# Altium footprint library con-molex.PCBLIB: 369 footprints (part 20 of 26)
Each footprint in its own frame and in the unit in brackets; x right, y up, seen from the top. Pads: shape width x height; smd on the part's side, far side on the other; paste and mask are expansions set on the pad; w line width, h text height; cw(c..) or ccw(c..) is an arc to the next point about the centre after c.
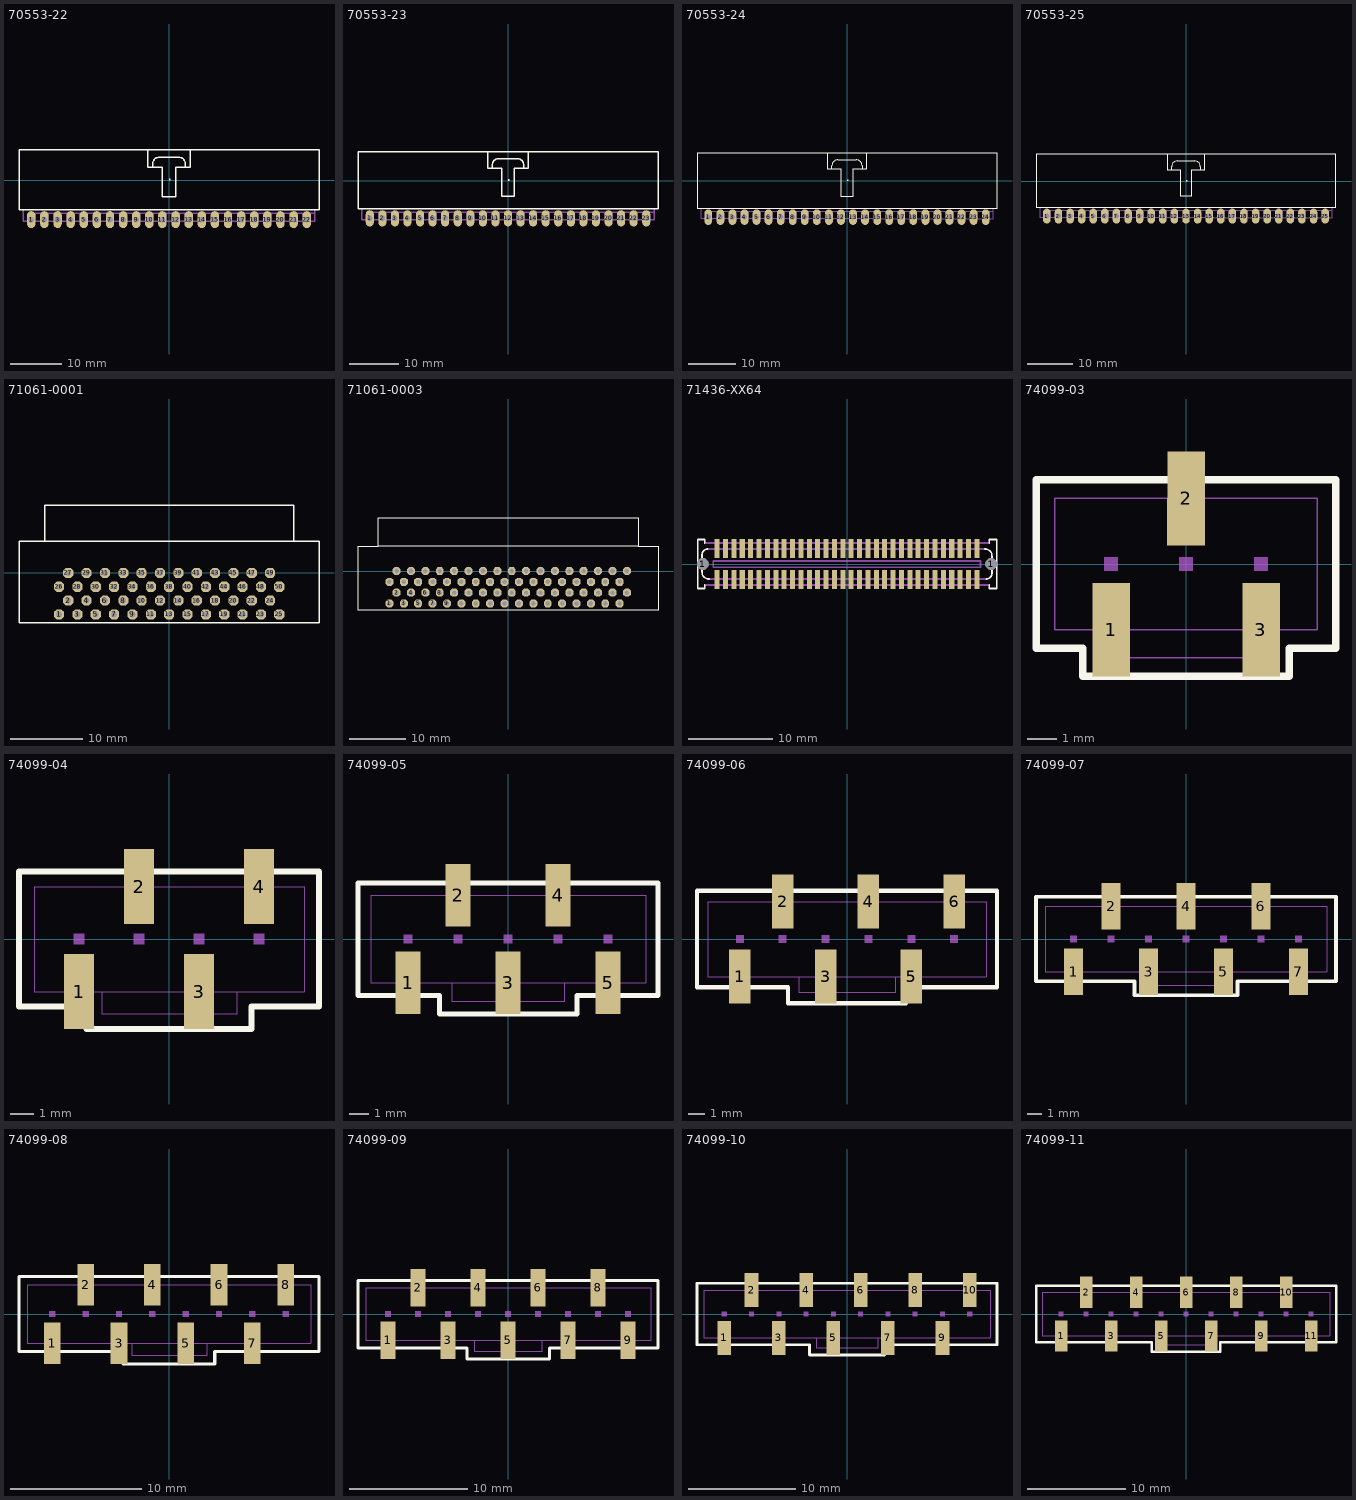
[diagram p19: the footprints below, top view; thin cyan lines are the x and y axes]

## 70553-22 [mil]
pads (22):
  oval 64.5x129 hole 43: 1(-1050,-300) 2(-950,-300) 3(-850,-300) 4(-750,-300) 5(-650,-300) 6(-550,-300) 7(-450,-300) 8(-350,-300) 9(-250,-300) 10(-150,-300) 11(-50,-300) 12(50,-300) 13(150,-300) 14(250,-300) 15(350,-300) 16(450,-300) 17(550,-300) 18(650,-300) 19(750,-300) 20(850,-300) 21(950,-300) 22(1050,-300)
Top Overlay:
  region: 0,0 10,0 10,10 0,10
  lines w10: -162.5,231.25 -162.5,100 -125,100 ; -125,100 -50,100 -50,-125 50,-125 50,100 125,100 ; -125,100 -125,125 cw(c-75,125) -75,175 75,175 cw(c75,125) 125,125 125,100 ; 125,100 162.5,100 162.5,231.25 ; 162.5,231.25 1143.75,231.25 1143.75,-225 -1143.75,-225 -1143.75,231.25 162.5,231.25
Mechanical 16:
  drawing of 178 lines, arcs and shapes, not listed

## 70553-23 [mil]
pads (23):
  oval 64.5x129 hole 43: 1(-1100,-300) 2(-1000,-300) 3(-900,-300) 4(-800,-300) 5(-700,-300) 6(-600,-300) 7(-500,-300) 8(-400,-300) 9(-300,-300) 10(-200,-300) 11(-100,-300) 12(0,-300) 13(100,-300) 14(200,-300) 15(300,-300) 16(400,-300) 17(500,-300) 18(600,-300) 19(700,-300) 20(800,-300) 21(900,-300) 22(1000,-300) 23(1100,-300)
Top Overlay:
  region: 0,0 10,0 10,10 0,10
  lines w10: -162.5,231.25 -162.5,100 -125,100 ; -125,100 -50,100 -50,-125 50,-125 50,100 125,100 ; -125,100 -125,125 cw(c-75,125) -75,175 75,175 cw(c75,125) 125,125 125,100 ; 125,100 162.5,100 162.5,231.25 ; 162.5,231.25 1193.75,231.25 1193.75,-225 -1193.75,-225 -1193.75,231.25 162.5,231.25
Mechanical 16:
  drawing of 186 lines, arcs and shapes, not listed

## 70553-24 [mil]
pads (24):
  oval 64.5x129 hole 43: 1(-1150,-300) 2(-1050,-300) 3(-950,-300) 4(-850,-300) 5(-750,-300) 6(-650,-300) 7(-550,-300) 8(-450,-300) 9(-350,-300) 10(-250,-300) 11(-150,-300) 12(-50,-300) 13(50,-300) 14(150,-300) 15(250,-300) 16(350,-300) 17(450,-300) 18(550,-300) 19(650,-300) 20(750,-300) 21(850,-300) 22(950,-300) 23(1050,-300) 24(1150,-300)
Top Overlay:
  region: 0,0 10,0 10,10 0,10
  lines w10: -162.5,231.25 -162.5,100 -125,100 ; -125,100 -50,100 -50,-125 50,-125 50,100 125,100 ; -125,100 -125,125 cw(c-75,125) -75,175 75,175 cw(c75,125) 125,125 125,100 ; 125,100 162.5,100 162.5,231.25 ; 162.5,231.25 1243.75,231.25 1243.75,-225 -1243.75,-225 -1243.75,231.25 162.5,231.25
Mechanical 16:
  drawing of 194 lines, arcs and shapes, not listed

## 70553-25 [mil]
pads (25):
  oval 64.5x129 hole 43: 1(-1200,-300) 2(-1100,-300) 3(-1000,-300) 4(-900,-300) 5(-800,-300) 6(-700,-300) 7(-600,-300) 8(-500,-300) 9(-400,-300) 10(-300,-300) 11(-200,-300) 12(-100,-300) 13(0,-300) 14(100,-300) 15(200,-300) 16(300,-300) 17(400,-300) 18(500,-300) 19(600,-300) 20(700,-300) 21(800,-300) 22(900,-300) 23(1000,-300) 24(1100,-300) 25(1200,-300)
Top Overlay:
  region: 0,0 10,0 10,10 0,10
  lines w10: -162.5,231.25 -162.5,100 -125,100 ; -125,100 -50,100 -50,-125 50,-125 50,100 125,100 ; -125,100 -125,125 cw(c-75,125) -75,175 75,175 cw(c75,125) 125,125 125,100 ; 125,100 162.5,100 162.5,231.25 ; 162.5,231.25 1293.75,231.25 1293.75,-225 -1293.75,-225 -1293.75,231.25 162.5,231.25
Mechanical 16:
  drawing of 202 lines, arcs and shapes, not listed

## 71061-0001 [mil]
pads (50):
  oct 55x55 hole 32: 1(-600,-225.59) 2(-550,-150.39) 3(-500,-225.59) 4(-450,-150.39) 5(-400,-225.59) 6(-350,-150.39) 7(-300,-225.59) 8(-250,-150.39) 9(-200,-225.59) 10(-150,-150.39) 11(-100,-225.59) 12(-50,-150.39) 13(0,-225.59) 14(50,-150.39) 15(100,-225.59) 16(150,-150.39) 17(200,-225.59) 18(250,-150.39) 19(300,-225.59) 20(350,-150.39) 21(400,-225.59) 22(450,-150.39) 23(500,-225.59) 24(550,-150.39) 25(600,-225.59) 26(-600,-75.2) 27(-550,0) 28(-500,-75.2) 29(-450,0) 30(-400,-75.2) 31(-350,0) 32(-300,-75.2) 33(-250,0) 34(-200,-75.2) 35(-150,0) 36(-100,-75.2) 37(-50,0) 38(0,-75.2) 39(50,0) 40(100,-75.2) 41(150,0) 42(200,-75.2) 43(250,0) 44(300,-75.2) 45(350,0) 46(400,-75.2) 47(450,0) 48(500,-75.2) 49(550,0) 50(600,-75.2)
Top Overlay:
  lines w8: -678.54,171.85 -818.31,171.85 -818.31,-271.06 816.34,-271.06 816.34,171.85 678.54,171.85 ; -678.54,171.85 -678.54,368.7 678.54,368.7 678.54,171.85 ; -678.54,171.85 678.54,171.85

## 71061-0003 [mil]
pads (68):
  oct 55x55 hole 32: 1(-825,-225.59) 2(-775,-150.39) 3(-725,-225.59) 4(-675,-150.39) 5(-625,-225.59) 6(-575,-150.39) 7(-525,-225.59) 8(-475,-150.39) 9(-425,-225.59) 10(-375,-150.39) 11(-325,-225.59) 12(-275,-150.39) 13(-225,-225.59) 14(-175,-150.39) 15(-125,-225.59) 16(-75,-150.39) 17(-25,-225.59) 18(25,-150.39) 19(75,-225.59) 20(125,-150.39) 21(175,-225.59) 22(225,-150.39) 23(275,-225.59) 24(325,-150.39) 25(375,-225.59) 26(425,-150.39) 27(475,-225.59) 28(525,-150.39) 29(575,-225.59) 30(625,-150.39) 31(675,-225.59) 32(725,-150.39) 33(775,-225.59) 34(825,-150.39) 35(-825,-75.2) 36(-775,0) 37(-725,-75.2) 38(-675,0) 39(-625,-75.2) 40(-575,0) 41(-525,-75.2) 42(-475,0) 43(-425,-75.2) 44(-375,0) 45(-325,-75.2) 46(-275,0) 47(-225,-75.2) 48(-175,0) 49(-125,-75.2) 50(-75,0) 51(-25,-75.2) 52(25,0) 53(75,-75.2) 54(125,0) 55(175,-75.2) 56(225,0) 57(275,-75.2) 58(325,0) 59(375,-75.2) 60(425,0) 61(475,-75.2) 62(525,0) 63(575,-75.2) 64(625,0) 65(675,-75.2) 66(725,0) 67(775,-75.2) 68(825,0)
Top Overlay:
  lines w8: -903.54,171.85 -1043.31,171.85 -1043.31,-271.06 1041.34,-271.06 1041.34,171.85 903.54,171.85 ; -903.54,171.85 -903.54,368.7 903.54,368.7 903.54,171.85 ; -903.54,171.85 903.54,171.85

## 71436-XX64 [mil]
pads (66):
  round 55.12 hole 55.12: 1(-677.17,0) 1(677.17,0)
  rect 23.62x90.55 smd: 1(-610.24,-72.83) 2(-570.87,-72.83) 3(-531.5,-72.83) 4(-492.13,-72.83) 5(-452.76,-72.83) 6(-413.39,-72.83) 7(-374.02,-72.83) 8(-334.65,-72.83) 9(-295.28,-72.83) 10(-255.91,-72.83) 11(-216.54,-72.83) 12(-177.17,-72.83) 13(-137.8,-72.83) 14(-98.43,-72.83) 15(-59.06,-72.83) 16(-19.69,-72.83) 17(19.69,-72.83) 18(59.06,-72.83) 19(98.43,-72.83) 20(137.8,-72.83) 21(177.17,-72.83) 22(216.54,-72.83) 23(255.91,-72.83) 24(295.28,-72.83) 25(334.65,-72.83) 26(374.02,-72.83) 27(413.39,-72.83) 28(452.76,-72.83) 29(492.13,-72.83) 30(531.5,-72.83) 31(570.87,-72.83) 32(610.24,-72.83) 33(-610.24,72.83) 34(-570.87,72.83) 35(-531.5,72.83) 36(-492.13,72.83) 37(-452.76,72.83) 38(-413.39,72.83) 39(-374.02,72.83) 40(-334.65,72.83) 41(-295.28,72.83) 42(-255.91,72.83) 43(-216.54,72.83) 44(-177.17,72.83) 45(-137.8,72.83) 46(-98.43,72.83) 47(-59.06,72.83) 48(-19.69,72.83) 49(19.69,72.83) 50(59.06,72.83) 51(98.43,72.83) 52(137.8,72.83) 53(177.17,72.83) 54(216.54,72.83) 55(255.91,72.83) 56(295.28,72.83) 57(334.65,72.83) 58(374.02,72.83) 59(413.39,72.83) 60(452.76,72.83) 61(492.13,72.83) 62(531.5,72.83) 63(570.87,72.83) 64(610.24,72.83)
Top Overlay:
  lines w8: -681.1,-39.37 ccw(c-649.21,-38.98) -648.82,-70.87 ; -681.1,-38.58 -681.1,40.16 cw(c-652.36,42.13) -654.33,70.87 ; -668.5,98.43 -668.5,114.96 -701.57,114.96 -701.57,-114.96 -667.72,-114.96 -667.72,-98.43 ; 648.82,70.87 cw(c649.21,38.98) 681.1,39.37 ; 654.33,-70.87 ccw(c652.36,-42.13) 681.1,-40.16 681.1,38.58 ; 667.72,98.43 667.72,114.96 703.15,114.96 703.15,-114.96 668.5,-114.96 668.5,-98.43
Mechanical 16:
  lines w8: -668.5,98.43 667.72,98.43 ; -667.72,-98.43 668.5,-98.43 ; -654.33,70.87 648.82,70.87 ; -648.82,-70.87 653.54,-70.87 654.33,-70.87 ; -628.35,-15.75 627.56,-15.75 627.56,14.17 -628.35,14.17 -628.35,-15.75

## 74099-03 [mil]
pads (3):
  rect 50x125 smd: 1(-100,-87.5) 2(0,87.5) 3(100,-87.5)
Top Overlay:
  lines w10: -200,-112.5 -200,112.5 200,112.5 200,-112.5 137.5,-112.5 137.5,-150 -137.5,-150 -137.5,-112.5 -200,-112.5
Mechanical 16:
  rectangle: -109.37,-9.37 -90.63,9.37
  rectangle: 90.63,-9.37 109.37,9.37
  rectangle: -9.37,-9.37 9.37,9.37
  lines w2: -112.5,-87.5 -175,-87.5 -175,87.5 175,87.5 175,-87.5 112.5,-87.5 ; -112.5,-87.5 112.5,-87.5 ; -112.5,-87.5 -112.5,-125 112.5,-125 112.5,-87.5
  text "1" at -162.5,-75 h62

## 74099-04 [mil]
pads (4):
  rect 50x125 smd: 1(-150,-87.5) 2(-50,87.5) 3(50,-87.5) 4(150,87.5)
Top Overlay:
  lines w10: -250,-112.5 -250,112.5 250,112.5 250,-112.5 137.5,-112.5 137.5,-150 -137.5,-150 -137.5,-112.5 -250,-112.5
Mechanical 16:
  rectangle: -59.37,-9.37 -40.63,9.37
  rectangle: -159.37,-9.37 -140.63,9.37
  rectangle: 140.63,-9.37 159.37,9.37
  rectangle: 40.63,-9.37 59.37,9.37
  lines w2: -112.5,-87.5 -225,-87.5 -225,87.5 225,87.5 225,-87.5 112.5,-87.5 ; -112.5,-87.5 112.5,-87.5 ; -112.5,-87.5 -112.5,-125 112.5,-125 112.5,-87.5
  text "1" at -212.5,-75 h62

## 74099-05 [mil]
pads (5):
  rect 50x125 smd: 1(-200,-87.5) 2(-100,87.5) 3(0,-87.5) 4(100,87.5) 5(200,-87.5)
Top Overlay:
  lines w10: -300,-112.5 -300,112.5 300,112.5 300,-112.5 137.5,-112.5 137.5,-150 -137.5,-150 -137.5,-112.5 -300,-112.5
Mechanical 16:
  rectangle: -9.37,-9.37 9.37,9.37
  rectangle: -109.37,-9.37 -90.63,9.37
  rectangle: 190.63,-9.37 209.37,9.37
  rectangle: 90.63,-9.37 109.37,9.37
  rectangle: -209.37,-9.37 -190.63,9.37
  lines w2: -112.5,-87.5 -275,-87.5 -275,87.5 275,87.5 275,-87.5 112.5,-87.5 ; -112.5,-87.5 112.5,-87.5 ; -112.5,-87.5 -112.5,-125 112.5,-125 112.5,-87.5
  text "1" at -262.5,-75 h62

## 74099-06 [mil]
pads (6):
  rect 50x125 smd: 1(-250,-87.5) 2(-150,87.5) 3(-50,-87.5) 4(50,87.5) 5(150,-87.5) 6(250,87.5)
Top Overlay:
  lines w10: -350,-112.5 -350,112.5 350,112.5 350,-112.5 137.5,-112.5 137.5,-150 -137.5,-150 -137.5,-112.5 -350,-112.5
Mechanical 16:
  rectangle: -59.37,-9.37 -40.63,9.37
  rectangle: -159.37,-9.37 -140.63,9.37
  rectangle: 140.63,-9.37 159.37,9.37
  rectangle: 40.63,-9.37 59.37,9.37
  rectangle: -259.37,-9.37 -240.63,9.37
  rectangle: 240.63,-9.37 259.37,9.37
  lines w2: -112.5,-87.5 -325,-87.5 -325,87.5 325,87.5 325,-87.5 112.5,-87.5 ; -112.5,-87.5 112.5,-87.5 ; -112.5,-87.5 -112.5,-125 112.5,-125 112.5,-87.5
  text "1" at -312.5,-75 h62

## 74099-07 [mil]
pads (7):
  rect 50x125 smd: 1(-300,-87.5) 2(-200,87.5) 3(-100,-87.5) 4(0,87.5) 5(100,-87.5) 6(200,87.5) 7(300,-87.5)
Top Overlay:
  lines w10: -400,-112.5 -400,112.5 400,112.5 400,-112.5 137.5,-112.5 137.5,-150 -137.5,-150 -137.5,-112.5 -400,-112.5
Mechanical 16:
  rectangle: -109.37,-9.37 -90.63,9.37
  rectangle: -209.37,-9.37 -190.63,9.37
  rectangle: 90.63,-9.37 109.37,9.37
  rectangle: -9.37,-9.37 9.37,9.37
  rectangle: -309.37,-9.37 -290.63,9.37
  rectangle: 190.63,-9.37 209.37,9.37
  rectangle: 290.63,-9.37 309.37,9.37
  lines w2: -112.5,-87.5 -375,-87.5 -375,87.5 375,87.5 375,-87.5 112.5,-87.5 ; -112.5,-87.5 112.5,-87.5 ; -112.5,-87.5 -112.5,-125 112.5,-125 112.5,-87.5
  text "1" at -362.5,-75 h62

## 74099-08 [mil]
pads (8):
  rect 50x125 smd: 1(-350,-87.5) 2(-250,87.5) 3(-150,-87.5) 4(-50,87.5) 5(50,-87.5) 6(150,87.5) 7(250,-87.5) 8(350,87.5)
Top Overlay:
  lines w10: -450,-112.5 -450,112.5 450,112.5 450,-112.5 137.5,-112.5 137.5,-150 -137.5,-150 -137.5,-112.5 -450,-112.5
Mechanical 16:
  rectangle: -159.37,-9.37 -140.63,9.37
  rectangle: -259.37,-9.37 -240.63,9.37
  rectangle: 40.63,-9.37 59.37,9.37
  rectangle: -59.37,-9.37 -40.63,9.37
  rectangle: -359.37,-9.37 -340.63,9.37
  rectangle: 140.63,-9.37 159.37,9.37
  rectangle: 240.63,-9.37 259.37,9.37
  rectangle: 340.63,-9.37 359.37,9.37
  lines w2: -112.5,-87.5 -425,-87.5 -425,87.5 425,87.5 425,-87.5 112.5,-87.5 ; -112.5,-87.5 112.5,-87.5 ; -112.5,-87.5 -112.5,-125 112.5,-125 112.5,-87.5
  text "1" at -412.5,-75 h62

## 74099-09 [mil]
pads (9):
  rect 50x125 smd: 1(-400,-87.5) 2(-300,87.5) 3(-200,-87.5) 4(-100,87.5) 5(0,-87.5) 6(100,87.5) 7(200,-87.5) 8(300,87.5) 9(400,-87.5)
Top Overlay:
  lines w10: -500,-112.5 -500,112.5 500,112.5 500,-112.5 137.5,-112.5 137.5,-150 -137.5,-150 -137.5,-112.5 -500,-112.5
Mechanical 16:
  rectangle: -209.37,-9.37 -190.63,9.37
  rectangle: -309.37,-9.37 -290.63,9.37
  rectangle: -9.37,-9.37 9.37,9.37
  rectangle: -109.37,-9.37 -90.63,9.37
  rectangle: -409.37,-9.37 -390.63,9.37
  rectangle: 90.63,-9.37 109.37,9.37
  rectangle: 190.63,-9.37 209.37,9.37
  rectangle: 290.63,-9.37 309.37,9.37
  rectangle: 390.63,-9.37 409.37,9.37
  lines w2: -112.5,-87.5 -475,-87.5 -475,87.5 475,87.5 475,-87.5 112.5,-87.5 ; -112.5,-87.5 112.5,-87.5 ; -112.5,-87.5 -112.5,-125 112.5,-125 112.5,-87.5
  text "1" at -462.5,-75 h62

## 74099-10 [mil]
pads (10):
  rect 50x125 smd: 1(-450,-87.5) 2(-350,87.5) 3(-250,-87.5) 4(-150,87.5) 5(-50,-87.5) 6(50,87.5) 7(150,-87.5) 8(250,87.5) 9(350,-87.5) 10(450,87.5)
Top Overlay:
  lines w10: -550,-112.5 -550,112.5 550,112.5 550,-112.5 137.5,-112.5 137.5,-150 -137.5,-150 -137.5,-112.5 -550,-112.5
Mechanical 16:
  rectangle: -259.37,-9.37 -240.63,9.37
  rectangle: -359.37,-9.37 -340.63,9.37
  rectangle: -59.37,-9.37 -40.63,9.37
  rectangle: -159.37,-9.37 -140.63,9.37
  rectangle: -459.37,-9.37 -440.63,9.37
  rectangle: 40.63,-9.37 59.37,9.37
  rectangle: 140.63,-9.37 159.37,9.37
  rectangle: 240.63,-9.37 259.37,9.37
  rectangle: 340.63,-9.37 359.37,9.37
  rectangle: 440.63,-9.37 459.37,9.37
  lines w2: -112.5,-87.5 -525,-87.5 -525,87.5 525,87.5 525,-87.5 112.5,-87.5 ; -112.5,-87.5 112.5,-87.5 ; -112.5,-87.5 -112.5,-125 112.5,-125 112.5,-87.5
  text "1" at -512.5,-75 h62

## 74099-11 [mil]
pads (11):
  rect 50x125 smd: 1(-500,-87.5) 2(-400,87.5) 3(-300,-87.5) 4(-200,87.5) 5(-100,-87.5) 6(0,87.5) 7(100,-87.5) 8(200,87.5) 9(300,-87.5) 10(400,87.5) 11(500,-87.5)
Top Overlay:
  lines w10: -600,-112.5 -600,112.5 600,112.5 600,-112.5 137.5,-112.5 137.5,-150 -137.5,-150 -137.5,-112.5 -600,-112.5
Mechanical 16:
  rectangle: -309.37,-9.37 -290.63,9.37
  rectangle: -409.37,-9.37 -390.63,9.37
  rectangle: -109.37,-9.37 -90.63,9.37
  rectangle: -209.37,-9.37 -190.63,9.37
  rectangle: -509.37,-9.37 -490.63,9.37
  rectangle: -9.37,-9.37 9.37,9.37
  rectangle: 90.63,-9.37 109.37,9.37
  rectangle: 190.63,-9.37 209.37,9.37
  rectangle: 290.63,-9.37 309.37,9.37
  rectangle: 390.63,-9.37 409.37,9.37
  rectangle: 490.63,-9.37 509.37,9.37
  lines w2: -112.5,-87.5 -575,-87.5 -575,87.5 575,87.5 575,-87.5 112.5,-87.5 ; -112.5,-87.5 112.5,-87.5 ; -112.5,-87.5 -112.5,-125 112.5,-125 112.5,-87.5
  text "1" at -562.5,-75 h62